# Altium footprint library LTM-2405.PcbLib: 22 footprints (part 1 of 2)
Each footprint in its own frame and in the unit in brackets; x right, y up, seen from the top. Pads: shape width x height; smd on the part's side, far side on the other; paste and mask are expansions set on the pad; w line width, h text height; cw(c..) or ccw(c..) is an arc to the next point about the centre after c.
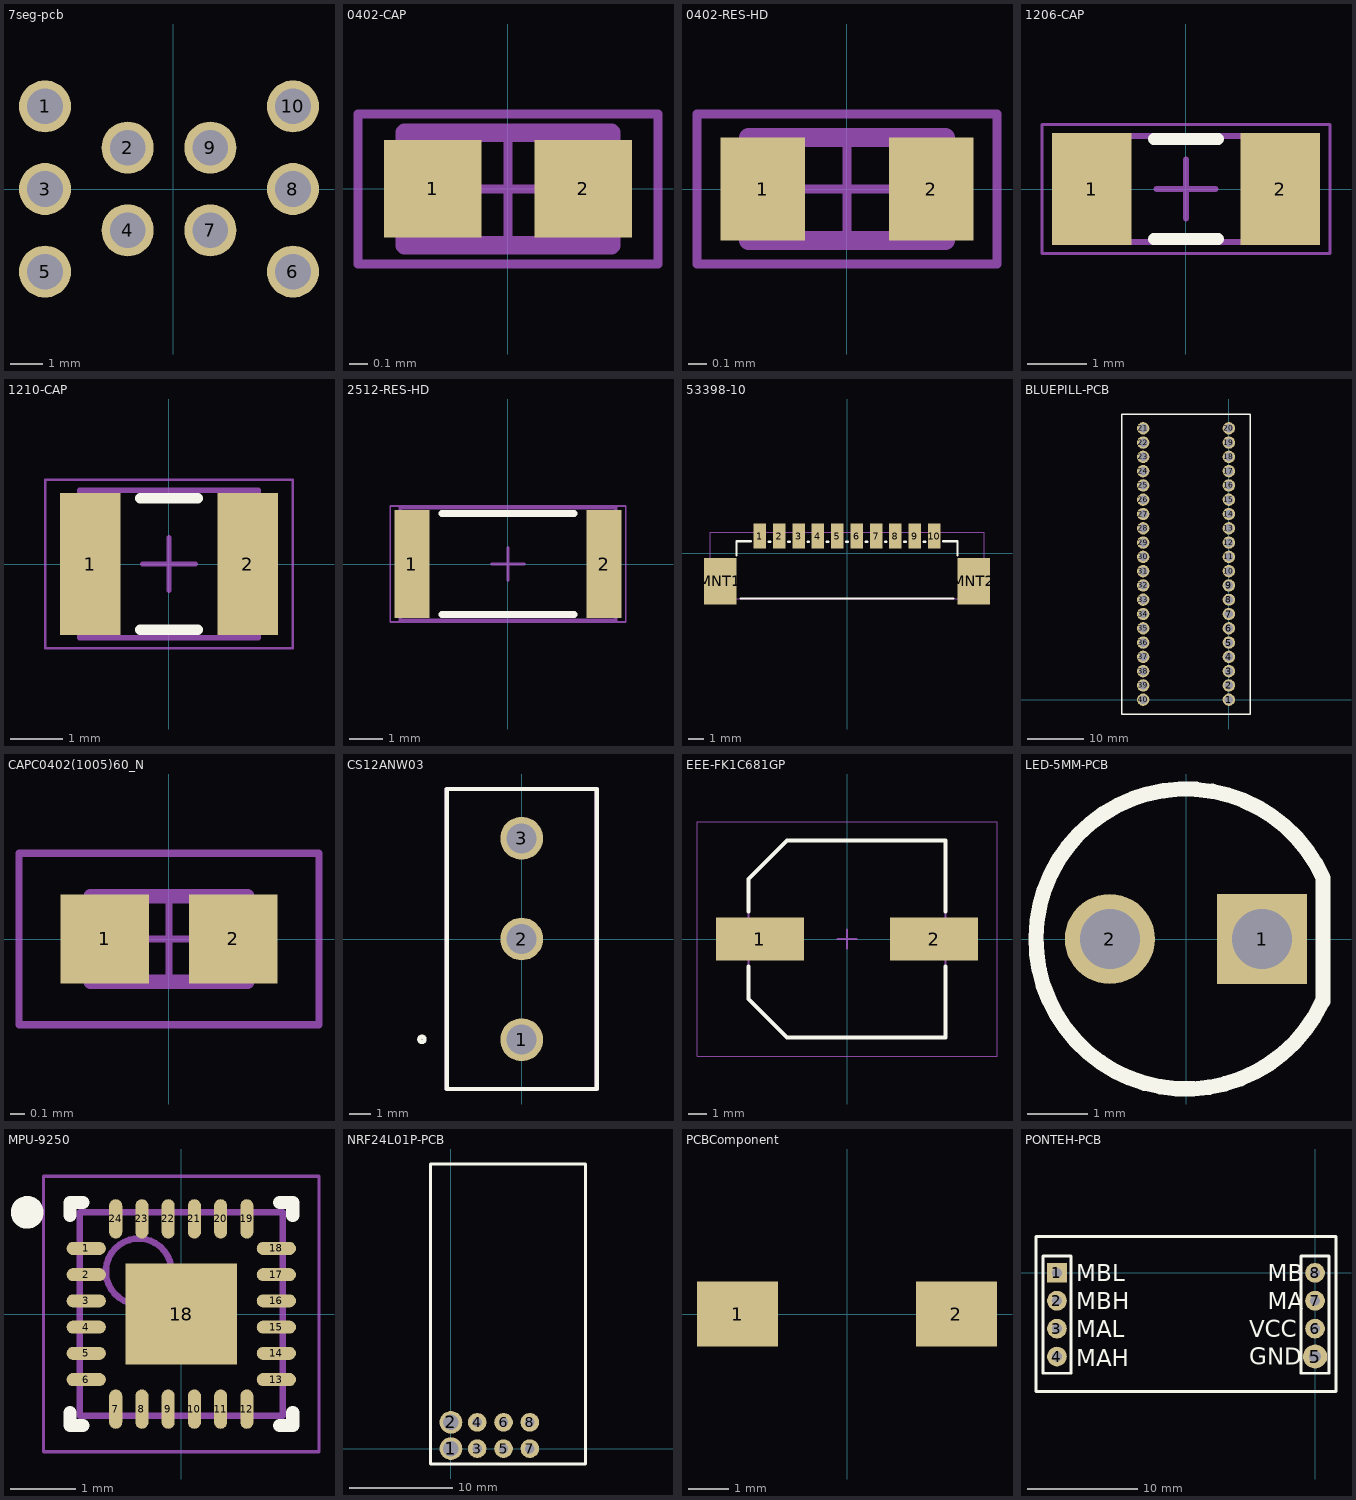
[diagram p0: the footprints below, top view; thin cyan lines are the x and y axes]

## 7seg-pcb [mm]
pads (10):
  round 1.6 hole 1.1: 1(-3.937,2.54) 2(-1.397,1.27) 3(-3.937,0) 4(-1.397,-1.27) 5(-3.937,-2.54) 6(3.683,-2.54) 7(1.143,-1.27) 8(3.683,0) 9(1.143,1.27) 10(3.683,2.54)
3D body "User Library-7-Segment2181AS.STEP": height 6.3, standoff -5.29, extent -5.127,-3.7 4.873,3.7

## 0402-CAP [mm]
pads (2):
  rect 0.52x0.52 smd: 1(-0.4,0) 2(0.4,0)
Mechanical 13:
  lines w0.1: -0.55,-0.3 0.55,-0.3 0.55,0.3 -0.55,0.3 -0.55,-0.3
Mechanical 15:
  lines w0.05: -0.3,0 0.3,0 ; 0,-0.3 0,0.3 ; -0.8,-0.4 0.8,-0.4 0.8,0.4 -0.8,0.4 -0.8,-0.4
Mechanical 29:
  lines w0.05: -0.8,-0.4 -0.8,0.4 0.8,0.4 0.8,-0.4 -0.8,-0.4
3D body: height 0.33, standoff 0, extent 0.3,-0.3 0.55,0.3
3D body: height 0.33, standoff 0, extent -0.55,-0.3 -0.3,0.3
3D body: height 0.33, standoff 0, extent -0.3,-0.3 0.3,0.3

## 0402-RES-HD [mm]
pads (2):
  rect 0.45x0.55 smd: 1(-0.45,0) 2(0.45,0)
Mechanical 13:
  lines w0.1: -0.525,-0.275 0.525,-0.275 0.525,0.275 -0.525,0.275 -0.525,-0.275
Mechanical 15:
  lines w0.05: -0.275,0 0.275,0 ; 0,-0.275 0,0.275 ; -0.8,-0.4 -0.8,0.4 0.8,0.4 0.8,-0.4 -0.8,-0.4
Mechanical 29:
  lines w0.05: -0.8,-0.4 0.8,-0.4 0.8,0.4 -0.8,0.4 -0.8,-0.4
3D body: height 0.4, standoff 0, extent 0.3,-0.275 0.525,0.275
3D body: height 0.4, standoff 0, extent -0.3,-0.275 0.3,0.275
3D body: height 0.4, standoff 0, extent -0.525,-0.275 -0.3,0.275

## 1206-CAP [mm]
pads (2):
  rect 1.35x1.9 smd: 1(-1.6,0) 2(1.6,0)
Top Overlay:
  lines w0.2: -0.55,-0.85 0.55,-0.85 ; -0.55,0.85 0.55,0.85
Mechanical 13:
  lines w0.1: -1.7,-0.9 -1.7,0.9 1.7,0.9 1.7,-0.9 -1.7,-0.9
Mechanical 15:
  lines w0.05: -2.45,-1.1 -2.45,1.1 2.45,1.1 2.45,-1.1 -2.45,-1.1
  lines w0.1: -0.5,0 0.5,0 ; 0,-0.5 0,0.5
Mechanical 29:
  lines w0.05: -2.45,-1.1 2.45,-1.1 2.45,1.1 -2.45,1.1 -2.45,-1.1
3D body: height 1.7, standoff 0, extent -1.2,-0.9 1.2,0.9
3D body: height 1.7, standoff 0, extent -1.7,-0.9 -1.2,0.9
3D body: height 1.7, standoff 0, extent 1.2,-0.9 1.7,0.9

## 1210-CAP [mm]
pads (2):
  rect 1.15x2.7 smd: 1(-1.5,0) 2(1.5,0)
Top Overlay:
  lines w0.2: -0.55,-1.25 0.55,-1.25 ; -0.55,1.25 0.55,1.25
Mechanical 13:
  lines w0.1: -1.7,-1.4 1.7,-1.4 1.7,1.4 -1.7,1.4 -1.7,-1.4
Mechanical 15:
  lines w0.05: -2.35,-1.6 -2.35,1.6 2.35,1.6 2.35,-1.6 -2.35,-1.6
  lines w0.1: -0.5,0 0.5,0 ; 0,-0.5 0,0.5
Mechanical 29:
  lines w0.05: -2.35,-1.6 2.35,-1.6 2.35,1.6 -2.35,1.6 -2.35,-1.6
3D body: height 2.8, standoff 0, extent 1.2,-1.4 1.7,1.4
3D body: height 2.8, standoff 0, extent -1.7,-1.4 -1.2,1.4
3D body: height 2.8, standoff 0, extent -1.2,-1.4 1.2,1.4

## 2512-RES-HD [mm]
pads (2):
  rect 1.05x3.25 smd: 1(-2.9,0) 2(2.9,0)
Top Overlay:
  lines w0.2: -2,-1.525 2,-1.525 ; -2,1.525 2,1.525
Mechanical 13:
  lines w0.1: -3.25,-1.7 -3.25,1.7 3.25,1.7 3.25,-1.7 -3.25,-1.7
Mechanical 15:
  lines w0.05: -3.55,-1.75 -3.55,1.75 3.55,1.75 3.55,-1.75 -3.55,-1.75
  lines w0.1: -0.5,0 0.5,0 ; 0,-0.5 0,0.5
Mechanical 29:
  lines w0.05: -3.55,-1.75 3.55,-1.75 3.55,1.75 -3.55,1.75 -3.55,-1.75
3D body: height 0.75, standoff 0, extent 2.63,-1.7 3.25,1.7
3D body: height 0.75, standoff 0, extent -2.63,-1.7 2.63,1.7
3D body: height 0.75, standoff 0, extent -3.25,-1.7 -2.63,1.7

## 53398-10 [mm]
pads (12):
  rect 0.8x1.6 smd: 1(-5.625,1.1) 2(-4.375,1.1) 3(-3.125,1.1) 4(-1.875,1.1) 5(-0.625,1.1) 6(0.625,1.1) 7(1.875,1.1) 8(3.125,1.1) 9(4.375,1.1) 10(5.625,1.1)
  rect 2.1x3 smd: MNT1(-8.175,-1.8) MNT2(8.175,-1.8)
Top Overlay:
  lines w0.152: -7.125,-0.125 -7.125,0.762 -6.2,0.762 ; -6.858,-2.921 6.858,-2.921 ; -5.05,0.727 -4.95,0.727 ; -3.8,0.727 -3.7,0.727 ; -2.55,0.727 -2.45,0.727 ; -1.3,0.727 -1.2,0.727 ; -0.05,0.727 0.05,0.727 ; 1.2,0.727 1.3,0.727 ; 2.45,0.727 2.55,0.727 ; 3.7,0.727 3.8,0.727 ; 4.95,0.727 5.05,0.727 ; 6.2,0.762 7.125,0.762 7.125,-0.125
Mechanical 29:
  lines w0.05: -8.814,-2.946 -8.814,1.346 8.839,1.346 8.839,-2.946 -8.814,-2.946
3D body "User Library-molex 53398.step": height 4.7, standoff 0, extent -8.825,-2.87 8.825,1.33

## BLUEPILL-PCB [mm]
pads (40):
  round 2.2 hole 1.5: 1(0,0) 2(0,2.54) 3(0,5.08) 4(0,7.62) 5(0,10.16) 6(0,12.7) 7(0,15.24) 9(0,20.32) 10(0,22.86) 11(0,25.4) 12(0,27.94) 13(0,30.48) 14(0,33.02) 15(0,35.56) 16(0,38.1) 17(0,40.64) 18(0,43.18) 19(0,45.72) 20(0,48.26) 21(-15.24,48.26) 22(-15.24,45.72) 23(-15.24,43.18) 24(-15.24,40.64) 25(-15.24,38.1) 26(-15.24,35.56) 27(-15.24,33.02) 28(-15.24,30.48) 29(-15.24,27.94) 30(-15.24,25.4) 31(-15.24,22.86) 32(-15.24,20.32) 33(-15.24,17.78) 34(-15.24,15.24) 35(-15.24,12.7) 36(-15.24,10.16) 37(-15.24,7.62) 38(-15.24,5.08) 39(-15.24,2.54) 40(-15.24,0)
  oval 2.2x2.1 hole 1.5: 8(0,17.78)
Top Overlay:
  lines w0.254: -19.05,-2.54 -19.05,50.8 3.8,50.8 3.8,-2.54 -19.05,-2.54
3D body "STM32F103C8T6_Blue_Pill v6.step": height 18.27, standoff 0, extent -19.05,-5.844 3.81,51.716

## CAPC0402(1005)60_N [mm]
pads (2):
  rect 0.62x0.62 smd: 1(-0.45,0) 2(0.45,0)
Mechanical 13:
  lines w0.1: -0.55,-0.3 -0.55,0.3 0.55,0.3 0.55,-0.3 -0.55,-0.3
Mechanical 15:
  lines w0.05: -0.3,0 0.3,0 ; 0,-0.3 0,0.3 ; -1.05,-0.6 -1.05,0.6 1.05,0.6 1.05,-0.6 -1.05,-0.6
3D body: height 0.6, standoff 0, extent -0.3,-0.3 0.3,0.3
3D body: height 0.6, standoff 0, extent -0.55,-0.3 -0.3,0.3
3D body: height 0.6, standoff 0, extent 0.3,-0.3 0.55,0.3

## CS12ANW03 [mm]
pads (3):
  round 2 hole 1.4: 1(0,-4.7) 2(0,0) 3(0,4.7)
Top Overlay:
  circle w0.2: c-4.654,-4.683 r0.123
  lines w0.2: -3.5,-7 -3.5,7 3.5,7 3.5,-7 -3.5,-7
Mechanical 15:
  lines w0.2: -3.5,-7 3.5,-7 3.5,7 -3.5,7 -3.5,-7
3D body "CS12ANW03.stp": height 14, standoff -3.91, extent -3.81,-6.998 3.505,6.998

## EEE-FK1C681GP [mm]
pads (2):
  rect 4.7x2.3 smd: 1(-4.65,0) 2(4.65,0)
Top Overlay:
  lines w0.2: -5.25,-1.45 -5.25,-3.2 -3.2,-5.25 5.25,-5.25 5.25,-1.45 ; -5.25,1.45 -5.25,3.2 -3.2,5.25 5.25,5.25 5.25,1.45
Mechanical 13:
  lines w0.1: -5.25,-3.2 -5.25,3.2 -3.2,5.25 5.25,5.25 5.25,-5.25 -3.2,-5.25 -5.25,-3.2
Mechanical 15:
  lines w0.05: -8,-6.25 8,-6.25 8,6.25 -8,6.25 -8,-6.25
  lines w0.1: -0.5,0 0.5,0 ; 0,-0.5 0,0.5
3D body "SW3dPS-capg.STEP": height 10.41, standoff -0.05, extent -5.65,-5.207 5.65,5.093

## LED-5MM-PCB [mm]
pads (2):
  rect 1.5x1.5 hole 1: 1(1.27,0)
  round 1.5 hole 1: 2(-1.27,0)
Top Overlay:
  lines w0.254: 2.262,-1.064 cw(c0,0) 2.285,1.015 2.285,-1.042
3D body "SW3dPS-LEDd5C.STEP": height 8.59, standoff -6.2, extent -2.98,-3.01 2.44,3.01

## MPU-9250 [mm]
pads (25):
  oval 0.6x0.2 smd: 1(-1.45,1) 2(-1.45,0.6) 3(-1.45,0.2) 4(-1.45,-0.2) 5(-1.45,-0.6) 6(-1.45,-1) 13(1.45,-1) 14(1.45,-0.6) 15(1.45,-0.2) 16(1.45,0.2) 17(1.45,0.6) 18(1.45,1)
  oval 0.2x0.6 smd: 7(-1,-1.45) 8(-0.6,-1.45) 9(-0.2,-1.45) 10(0.2,-1.45) 11(0.6,-1.45) 12(1,-1.45) 19(1,1.45) 20(0.6,1.45) 21(0.2,1.45) 22(-0.2,1.45) 23(-0.6,1.45) 24(-1,1.45)
  rect 1.7x1.54 smd: 18(0,0)
Top Overlay:
  circle w0.25: c-2.35,1.55 r0.125
  lines w0.2: -1.7,-1.5 -1.7,-1.7 -1.5,-1.7 ; -1.7,1.5 -1.7,1.7 -1.5,1.7 ; 1.5,-1.7 1.7,-1.7 1.7,-1.5 ; 1.5,1.7 1.7,1.7 1.7,1.5
Mechanical 13:
  circle w0.1: c-0.65,0.65 r0.5
  lines w0.1: -1.55,-1.55 1.55,-1.55 1.55,1.55 -1.55,1.55 -1.55,-1.55
Mechanical 15:
  lines w0.05: -2.1,-2.1 2.1,-2.1 2.1,2.1 -2.1,2.1 -2.1,-2.1
  lines w0.1: -0.5,0 0.5,0 ; 0,-0.5 0,0.5
3D body "QFN40P300X300X105_HS-25N.step": height 1.05, standoff 0, extent -1.551,-1.551 1.551,1.551

## NRF24L01P-PCB [mm]
pads (8):
  round 2.2 hole 1.5: 1(0,0) 2(0,2.54)
  round 1.8 hole 0.9: 3(2.54,0) 4(2.54,2.54) 5(5.08,0) 6(5.08,2.54) 7(7.62,0) 8(7.62,2.54)
Top Overlay:
  lines w0.254: -1.975,-1.485 13,-1.485 13,27.49 -1.975,27.49 -1.975,-1.485
3D body "nRF24L01+_enhanced.SLDPRT": height 6.8, standoff -6.05, extent -1.988,-1.499 13.012,27.501

## PCBComponent [mm]
pads (2):
  rect 2x1.6 smd: 1(-2.7,0) 2(2.7,0)
3D body "95C04B.STEP": height 5, standoff 0, extent -3.649,-1.75 3.65,1.75

## PONTEH-PCB [mm]
pads (8):
  rect 1.8x1.8 hole 0.9: 1(-23.495,0)
  round 1.8 hole 0.9: 2(-23.495,-2.54) 3(-23.495,-5.08) 4(-23.495,-7.62) 6(0,-5.08) 7(0,-2.54) 8(0,0)
  round 2.2 hole 1.1: 5(0,-7.62)
Top Overlay:
  lines w0.254: 1.905,3.302 1.905,-10.795 -25.4,-10.795 -25.4,3.302 1.905,3.302 ; 1.905,3.302 1.905,3.302 ; -24.765,-9.144 -24.765,1.524 -22.225,1.524 -22.225,-9.144 -24.765,-9.144 ; -1.27,-9.144 -1.27,1.524 1.27,1.524 1.27,-9.144 -1.27,-9.144
  text "MBL" at -21.717,-0.762 h1.52
  text "MBH" at -21.717,-3.302 h1.52
  text "MAL" at -21.717,-5.842 h1.52
  text "MAH" at -21.717,-8.509 h1.52
  text "MB" at -4.318,-0.762 h1.52
  text "MA" at -4.318,-3.302 h1.52
  text "VCC" at -5.969,-5.842 h1.52
  text "GND" at -5.969,-8.382 h1.52
3D body "Módulo Ponte H.x_t": height 14.75, standoff 0.53, extent -25.463,-10.795 1.841,3.302
3D body "_ _ _C041LFBN-RC.STEP": height 8.5, standoff -3.2, extent -24.765,-9.14 -22.225,1.52
3D body "_ _ _C041LFBN-RC.STEP": height 8.5, standoff -3.2, extent -1.27,-9.14 1.27,1.52